# Altium footprint library Selex_PCBLib.PcbLib: 388 footprints (part 21 of 25)
Each footprint in its own frame and in the unit in brackets; x right, y up, seen from the top. Pads: shape width x height; smd on the part's side, far side on the other; paste and mask are expansions set on the pad; w line width, h text height; cw(c..) or ccw(c..) is an arc to the next point about the centre after c.
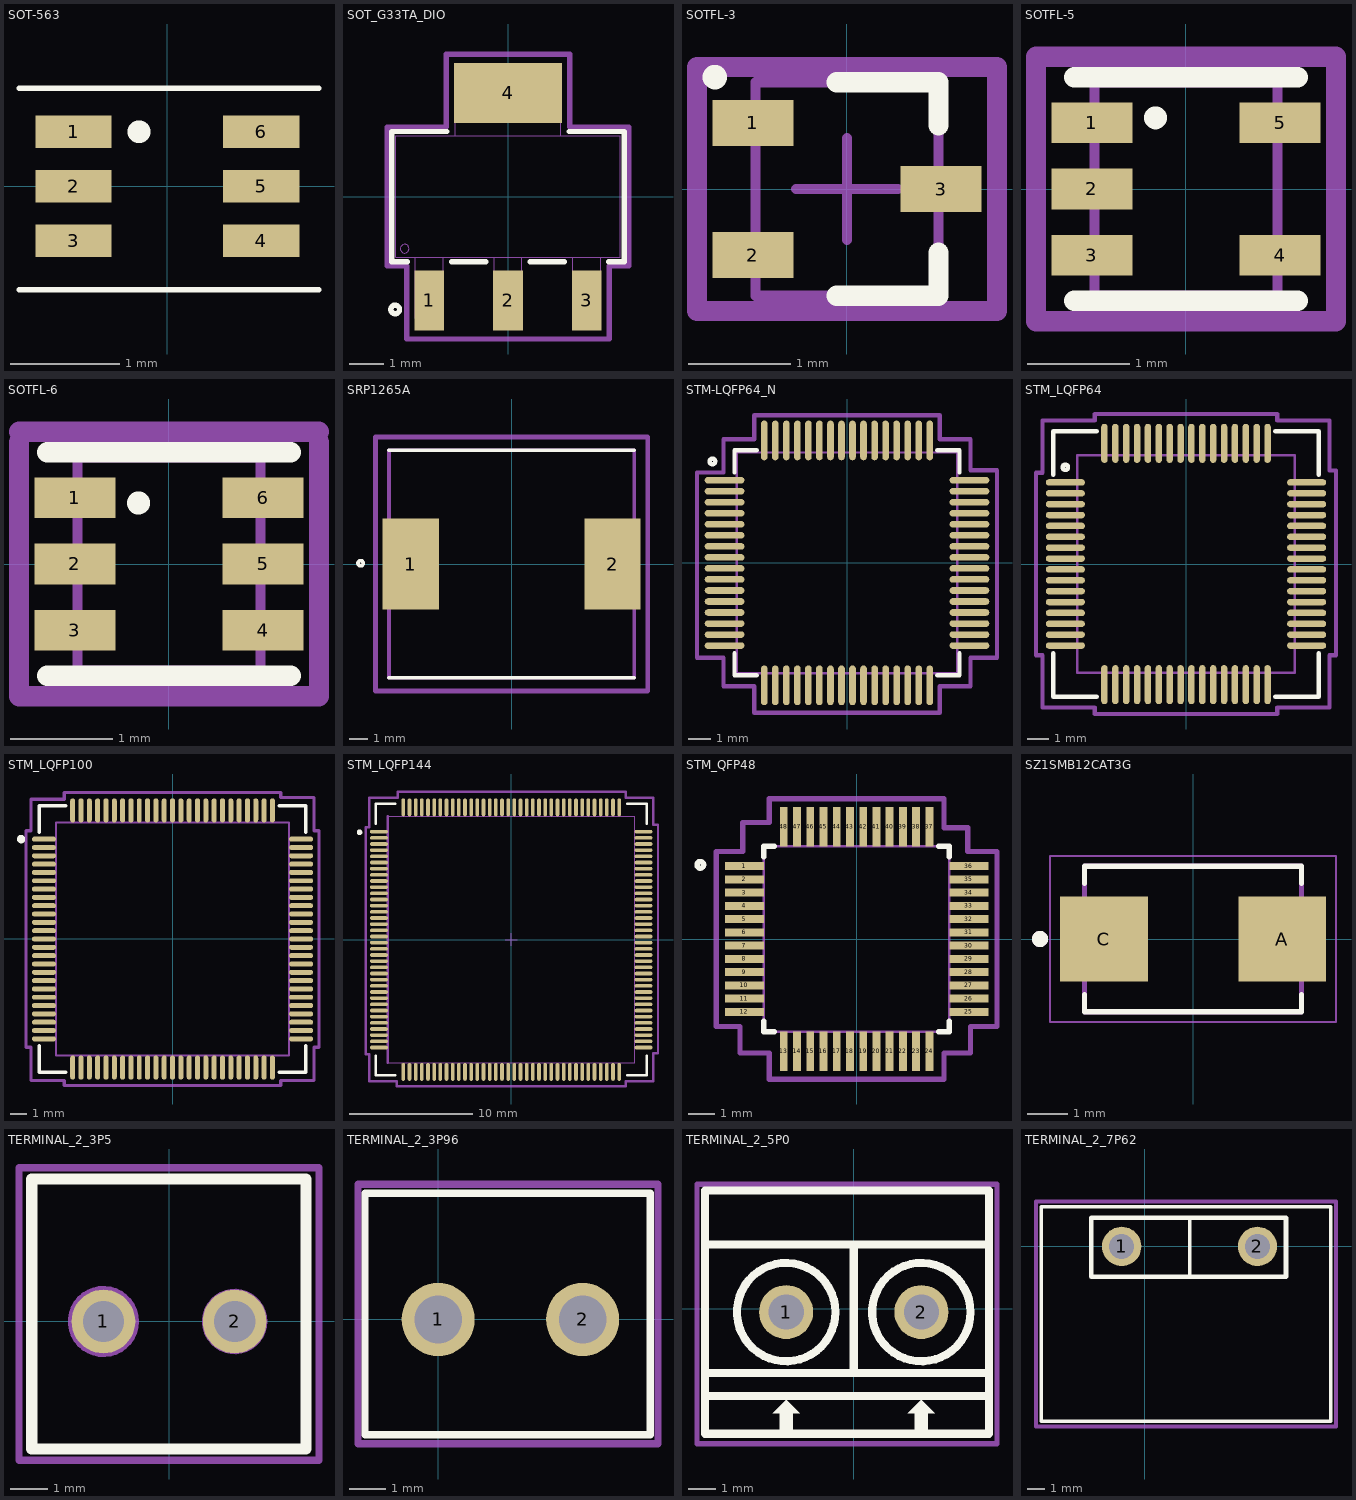
[diagram p20: the footprints below, top view; thin cyan lines are the x and y axes]

## SOT-563 [mm]
pads (6):
  rect 0.7x0.3 smd: 1(-0.86,0.5) 2(-0.86,0) 3(-0.86,-0.5) 4(0.86,-0.5) 5(0.86,0) 6(0.86,0.5)
Top Overlay:
  circle w0.2: c-0.26,0.5 r0.005
  lines w0.05: -1.36,-0.95 1.39,-0.95 ; -1.36,0.9 1.39,0.9
3D body "SOT563_AP61100QZ6-7_DIO.step": height 0.61, standoff 0, extent -0.91,-0.851 0.79,0.851

## SOT_G33TA_DIO [mil]
pads (4):
  rect 34x69 smd paste+0 mask+0: 1(-90.55,-119.5) 2(0,-119.5) 3(90.55,-119.5)
  rect 124x69 smd paste+0 mask+0: 4(0,119.5)
Top Overlay:
  circle w6: c-130,-130 r5
  lines w6: -116.01,-75 -134,-75 -134,75 -70.46,75 ; -65.09,-75 -25.46,-75 ; 25.46,-75 65.09,-75 ; 70.46,75 134,75 134,-75 116.01,-75
Mechanical 13:
  circle w0: c-119,-60 r5
  lines w1: -129,-70 -129,70 129,70 129,-70 -129,-70 ; -106.55,-140 -74.55,-140 -74.55,-70 -106.55,-70 -106.55,-140 ; -61,70 -61,140 61,140 61,70 -61,70 ; -16,-140 16,-140 16,-70 -16,-70 -16,-140 ; 74.55,-140 106.55,-140 106.55,-70 74.55,-70 74.55,-140
Mechanical 15:
  lines w6: -139,-80 -116.55,-80 -116.55,-164 116.55,-164 116.55,-80 139,-80 139,80 71,80 71,164 -71,164 -71,80 -139,80 -139,-80
3D body: height 10, standoff 0, extent 0,0 10,10

## SOTFL-3 [mm]
pads (3):
  rect 0.8x0.45 smd: 1(-0.925,0.65) 2(-0.925,-0.65) 3(0.925,0)
Top Overlay:
  circle w0.2: c-1.3,1.1 r0.02
  lines w0.2: -0.1,-1.05 0.9,-1.05 0.9,-0.625 ; -0.1,1.05 0.9,1.05 0.9,0.625
Mechanical 13:
  lines w0.1: -0.9,-1.05 -0.9,1.05 0.9,1.05 0.9,-1.05 -0.9,-1.05
Mechanical 15:
  lines w0.1: -0.5,0 0.5,0 ; 0,-0.5 0,0.5
  lines w0.2: -1.475,-1.2 -1.475,1.2 1.475,1.2 1.475,-1.2 -1.475,-1.2
3D body "User Library-sot-3p290x130ll237h100.STEP": height 1, standoff 0, extent -1.085,-1.45 1.285,1.45

## SOTFL-5 [mm]
pads (5):
  rect 0.8x0.4 smd: 1(-0.925,0.65) 2(-0.925,0) 3(-0.925,-0.65) 4(0.925,-0.65) 5(0.925,0.65)
Top Overlay:
  circle w0.2: c-0.3,0.7 r0.012
  lines w0.2: -1.1,-1.1 1.1,-1.1 ; -1.1,1.1 1.1,1.1
Mechanical 13:
  lines w0.1: -0.9,-1.05 0.9,-1.05 0.9,1.05 -0.9,1.05 -0.9,-1.05
Mechanical 15:
  lines w0.2: -1.475,-1.3 1.475,-1.3 1.475,1.3 -1.475,1.3 -1.475,-1.3
3D body: height 0.75, standoff 0, extent -0.9,-1.05 0.9,1.05

## SOTFL-6 [mm]
pads (6):
  rect 0.8x0.4 smd: 1(-0.925,0.65) 2(-0.925,0) 3(-0.925,-0.65) 4(0.925,-0.65) 5(0.925,0) 6(0.925,0.65)
Top Overlay:
  circle w0.2: c-0.3,0.6 r0.012
  lines w0.2: -1.2,-1.1 1.2,-1.1 ; -1.2,1.1 1.2,1.1
Mechanical 13:
  lines w0.1: -0.9,-1.05 -0.9,1.05 0.9,1.05 0.9,-1.05 -0.9,-1.05
Mechanical 15:
  lines w0.2: -1.475,1.2 -1.475,-1.3 1.475,-1.3 1.475,1.2 ; -1.475,1.3 -0.737,1.3 0.738,1.3 1.475,1.3
3D body: height 0.75, standoff 0, extent -0.9,-1.05 0.9,1.05

## SRP1265A [mm]
pads (2):
  rect 3.1x5 smd: 1(-5.55,0) 2(5.55,0)
Top Overlay:
  circle w0.2: c-8.311,0.042 r0.143
  lines w0.2: -6.75,-6.25 6.75,-6.25 ; -6.75,6.25 6.75,6.25
Mechanical 13:
  lines w0.2: -6.75,-6.25 -6.75,6.25 6.75,6.25 6.75,-6.25 -6.75,-6.25
Mechanical 15:
  lines w0.254: -7.493,-6.985 -7.493,6.985 7.493,6.985 7.493,-6.985 -7.493,-6.985
3D body "SRP1265A series.stp": height 6.31, standoff 0, extent -6.4,-6.2 6.5,6.3

## STM-LQFP64_N [mm] "Thin QFP, 64-Leads, Body 10x10mm, Pitch 0.5mm, IPC Medium Density"
height 1.6
pads (64):
  oval 1.8x0.3 smd: 1(-5.55,3.75) 2(-5.55,3.25) 3(-5.55,2.75) 4(-5.55,2.25) 5(-5.55,1.75) 6(-5.55,1.25) 7(-5.55,0.75) 8(-5.55,0.25) 9(-5.55,-0.25) 10(-5.55,-0.75) 11(-5.55,-1.25) 12(-5.55,-1.75) 13(-5.55,-2.25) 14(-5.55,-2.75) 15(-5.55,-3.25) 16(-5.55,-3.75) 33(5.55,-3.75) 34(5.55,-3.25) 35(5.55,-2.75) 36(5.55,-2.25) 37(5.55,-1.75) 38(5.55,-1.25) 39(5.55,-0.75) 40(5.55,-0.25) 41(5.55,0.25) 42(5.55,0.75) 43(5.55,1.25) 44(5.55,1.75) 45(5.55,2.25) 46(5.55,2.75) 47(5.55,3.25) 48(5.55,3.75)
  oval 0.3x1.8 smd: 17(-3.75,-5.55) 18(-3.25,-5.55) 19(-2.75,-5.55) 20(-2.25,-5.55) 21(-1.75,-5.55) 22(-1.25,-5.55) 23(-0.75,-5.55) 24(-0.25,-5.55) 25(0.25,-5.55) 26(0.75,-5.55) 27(1.25,-5.55) 28(1.75,-5.55) 29(2.25,-5.55) 30(2.75,-5.55) 31(3.25,-5.55) 32(3.75,-5.55) 49(3.75,5.55) 50(3.25,5.55) 51(2.75,5.55) 52(2.25,5.55) 53(1.75,5.55) 54(1.25,5.55) 55(0.75,5.55) 56(0.25,5.55) 57(-0.25,5.55) 58(-0.75,5.55) 59(-1.25,5.55) 60(-1.75,5.55) 61(-2.25,5.55) 62(-2.75,5.55) 63(-3.25,5.55) 64(-3.75,5.55)
Top Overlay:
  circle w0.2: c-6.1,4.6 r0.125
  lines w0.2: -5.1,-4.1 -5.1,-5.1 -4.1,-5.1 ; -5.1,4.1 -5.1,5.1 -4.1,5.1 ; 4.1,-5.1 5.1,-5.1 5.1,-4.1 ; 4.1,5.1 5.1,5.1 5.1,4.1
Mechanical 13:
  lines w0.1: -5,-5 -5,5 5,5 5,-5 -5,-5
Mechanical 15:
  lines w0.2: -6.8,-4.3 -6.8,4.1 -5.6,4.1 -5.6,5.6 -4.2,5.6 -4.2,6.7 4.2,6.7 4.2,5.6 5.6,5.6 5.6,4.2 6.8,4.2 6.8,-4.3 5.6,-4.3 5.6,-5.6 4.2,-5.6 4.2,-6.8 -4.2,-6.8 -4.2,-5.6 -5.6,-5.6 -5.6,-4.3 -6.8,-4.3
3D body: height 1.6, standoff 0.05, extent -5,-5 5,5

## STM_LQFP64 [mm]
pads (64):
  oval 1.8x0.3 smd: 1(-5.55,3.75) 2(-5.55,3.25) 3(-5.55,2.75) 4(-5.55,2.25) 5(-5.55,1.75) 6(-5.55,1.25) 7(-5.55,0.75) 8(-5.55,0.25) 9(-5.55,-0.25) 10(-5.55,-0.75) 11(-5.55,-1.25) 12(-5.55,-1.75) 13(-5.55,-2.25) 14(-5.55,-2.75) 15(-5.55,-3.25) 16(-5.55,-3.75) 33(5.55,-3.75) 34(5.55,-3.25) 35(5.55,-2.75) 36(5.55,-2.25) 37(5.55,-1.75) 38(5.55,-1.25) 39(5.55,-0.75) 40(5.55,-0.25) 41(5.55,0.25) 42(5.55,0.75) 43(5.55,1.25) 44(5.55,1.75) 45(5.55,2.25) 46(5.55,2.75) 47(5.55,3.25) 48(5.55,3.75)
  oval 0.3x1.8 smd: 17(-3.75,-5.55) 18(-3.25,-5.55) 19(-2.75,-5.55) 20(-2.25,-5.55) 21(-1.75,-5.55) 22(-1.25,-5.55) 23(-0.75,-5.55) 24(-0.25,-5.55) 25(0.25,-5.55) 26(0.75,-5.55) 27(1.25,-5.55) 28(1.75,-5.55) 29(2.25,-5.55) 30(2.75,-5.55) 31(3.25,-5.55) 32(3.75,-5.55) 49(3.75,5.55) 50(3.25,5.55) 51(2.75,5.55) 52(2.25,5.55) 53(1.75,5.55) 54(1.25,5.55) 55(0.75,5.55) 56(0.25,5.55) 57(-0.25,5.55) 58(-0.75,5.55) 59(-1.25,5.55) 60(-1.75,5.55) 61(-2.25,5.55) 62(-2.75,5.55) 63(-3.25,5.55) 64(-3.75,5.55)
Top Overlay:
  circle w0.2: c-5.55,4.45 r0.125
  lines w0.2: -6.1,-4.1 -6.1,-6.1 -4.1,-6.1 ; -6.1,4.1 -6.1,6.1 -4.1,6.1 ; 4.1,-6.1 6.1,-6.1 6.1,-4.1 ; 4.1,6.1 6.1,6.1 6.1,4.1
Mechanical 13:
  lines w0.1: -5,-5 5,-5 5,5 -5,5 -5,-5
Mechanical 15:
  lines w0.2: -6.9,-4.2 -6.6,-4.2 -6.6,-6.6 -4.2,-6.6 -4.2,-6.9 4.2,-6.9 4.2,-6.6 6.6,-6.6 6.6,-4.2 6.9,-4.2 6.9,4.3 6.6,4.3 6.6,6.6 4.2,6.6 4.2,6.9 -4.2,6.9 -4.2,6.6 -6.6,6.6 -6.6,4.2 -6.9,4.2 -6.9,-4.2
3D body "LQFP64 v1.step": height 1.6, standoff 0.02, extent -6.069,-6.069 6.069,6.069

## STM_LQFP100 [mm]
pads (100):
  oval 1.45x0.3 smd: 1(-7.725,6) 2(-7.725,5.5) 3(-7.725,5) 4(-7.725,4.5) 5(-7.725,4) 6(-7.725,3.5) 7(-7.725,3) 8(-7.725,2.5) 9(-7.725,2) 10(-7.725,1.5) 11(-7.725,1) 12(-7.725,0.5) 13(-7.725,0) 14(-7.725,-0.5) 15(-7.725,-1) 16(-7.725,-1.5) 17(-7.725,-2) 18(-7.725,-2.5) 19(-7.725,-3) 20(-7.725,-3.5) 21(-7.725,-4) 22(-7.725,-4.5) 23(-7.725,-5) 24(-7.725,-5.5) 25(-7.725,-6) 51(7.725,-6) 52(7.725,-5.5) 53(7.725,-5) 54(7.725,-4.5) 55(7.725,-4) 56(7.725,-3.5) 57(7.725,-3) 58(7.725,-2.5) 59(7.725,-2) 60(7.725,-1.5) 61(7.725,-1) 62(7.725,-0.5) 63(7.725,0) 64(7.725,0.5) 65(7.725,1) 66(7.725,1.5) 67(7.725,2) 68(7.725,2.5) 69(7.725,3) 70(7.725,3.5) 71(7.725,4) 72(7.725,4.5) 73(7.725,5) 74(7.725,5.5) 75(7.725,6)
  oval 0.3x1.45 smd: 26(-6,-7.725) 27(-5.5,-7.725) 28(-5,-7.725) 29(-4.5,-7.725) 30(-4,-7.725) 31(-3.5,-7.725) 32(-3,-7.725) 33(-2.5,-7.725) 34(-2,-7.725) 35(-1.5,-7.725) 36(-1,-7.725) 37(-0.5,-7.725) 38(0,-7.725) 39(0.5,-7.725) 40(1,-7.725) 41(1.5,-7.725) 42(2,-7.725) 43(2.5,-7.725) 44(3,-7.725) 45(3.5,-7.725) 46(4,-7.725) 47(4.5,-7.725) 48(5,-7.725) 49(5.5,-7.725) 50(6,-7.725) 76(6,7.725) 77(5.5,7.725) 78(5,7.725) 79(4.5,7.725) 80(4,7.725) 81(3.5,7.725) 82(3,7.725) 83(2.5,7.725) 84(2,7.725) 85(1.5,7.725) 86(1,7.725) 87(0.5,7.725) 88(0,7.725) 89(-0.5,7.725) 90(-1,7.725) 91(-1.5,7.725) 92(-2,7.725) 93(-2.5,7.725) 94(-3,7.725) 95(-3.5,7.725) 96(-4,7.725) 97(-4.5,7.725) 98(-5,7.725) 99(-5.5,7.725) 100(-6,7.725)
Top Overlay:
  circle w0.25: c-9.1,6 r0.125
  lines w0.2: -8,-6.4 -8,-8 -6.4,-8 ; -8,6.4 -8,8 -6.4,8 ; 6.4,-8 8,-8 8,-6.4 ; 6.4,8 8,8 8,6.4
Mechanical 13:
  lines w0.1: -7,-7 7,-7 7,7 -7,7 -7,-7
Mechanical 15:
  lines w0.2: -8.8,-6.5 -8.8,6.5 -8.5,6.5 -8.5,8.4 -6.5,8.4 -6.5,8.8 6.5,8.8 6.5,8.5 8.5,8.5 8.5,6.5 8.8,6.5 8.8,-6.5 8.5,-6.5 8.5,-8.5 6.5,-8.5 6.5,-8.8 -6.5,-8.8 -6.5,-8.5 -8.5,-8.5 -8.5,-6.5 -8.8,-6.5
3D body "LQFP100.step": height 1.6, standoff 0, extent -8,-8 8,8

## STM_LQFP144 [mm]
pads (144):
  oval 1.45x0.3 smd: 1(-10.725,8.75) 2(-10.725,8.25) 3(-10.725,7.75) 4(-10.725,7.25) 5(-10.725,6.75) 6(-10.725,6.25) 7(-10.725,5.75) 8(-10.725,5.25) 9(-10.725,4.75) 10(-10.725,4.25) 11(-10.725,3.75) 12(-10.725,3.25) 13(-10.725,2.75) 14(-10.725,2.25) 15(-10.725,1.75) 16(-10.725,1.25) 17(-10.725,0.75) 18(-10.725,0.25) 19(-10.725,-0.25) 20(-10.725,-0.75) 21(-10.725,-1.25) 22(-10.725,-1.75) 23(-10.725,-2.25) 24(-10.725,-2.75) 25(-10.725,-3.25) 26(-10.725,-3.75) 27(-10.725,-4.25) 28(-10.725,-4.75) 29(-10.725,-5.25) 30(-10.725,-5.75) 31(-10.725,-6.25) 32(-10.725,-6.75) 33(-10.725,-7.25) 34(-10.725,-7.75) 35(-10.725,-8.25) 36(-10.725,-8.75) 73(10.725,-8.75) 74(10.725,-8.25) 75(10.725,-7.75) 76(10.725,-7.25) 77(10.725,-6.75) 78(10.725,-6.25) 79(10.725,-5.75) 80(10.725,-5.25) 81(10.725,-4.75) 82(10.725,-4.25) 83(10.725,-3.75) 84(10.725,-3.25) 85(10.725,-2.75) 86(10.725,-2.25) 87(10.725,-1.75) 88(10.725,-1.25) 89(10.725,-0.75) 90(10.725,-0.25) 91(10.725,0.25) 92(10.725,0.75) 93(10.725,1.25) 94(10.725,1.75) 95(10.725,2.25) 96(10.725,2.75) 97(10.725,3.25) 98(10.725,3.75) 99(10.725,4.25) 100(10.725,4.75) 101(10.725,5.25) 102(10.725,5.75) 103(10.725,6.25) 104(10.725,6.75) 105(10.725,7.25) 106(10.725,7.75) 107(10.725,8.25) 108(10.725,8.75)
  oval 0.3x1.45 smd: 37(-8.75,-10.725) 38(-8.25,-10.725) 39(-7.75,-10.725) 40(-7.25,-10.725) 41(-6.75,-10.725) 42(-6.25,-10.725) 43(-5.75,-10.725) 44(-5.25,-10.725) 45(-4.75,-10.725) 46(-4.25,-10.725) 47(-3.75,-10.725) 48(-3.25,-10.725) 49(-2.75,-10.725) 50(-2.25,-10.725) 51(-1.75,-10.725) 52(-1.25,-10.725) 53(-0.75,-10.725) 54(-0.25,-10.725) 55(0.25,-10.725) 56(0.75,-10.725) 57(1.25,-10.725) 58(1.75,-10.725) 59(2.25,-10.725) 60(2.75,-10.725) 61(3.25,-10.725) 62(3.75,-10.725) 63(4.25,-10.725) 64(4.75,-10.725) 65(5.25,-10.725) 66(5.75,-10.725) 67(6.25,-10.725) 68(6.75,-10.725) 69(7.25,-10.725) 70(7.75,-10.725) 71(8.25,-10.725) 72(8.75,-10.725) 109(8.75,10.725) 110(8.25,10.725) 111(7.75,10.725) 112(7.25,10.725) 113(6.75,10.725) 114(6.25,10.725) 115(5.75,10.725) 116(5.25,10.725) 117(4.75,10.725) 118(4.25,10.725) 119(3.75,10.725) 120(3.25,10.725) 121(2.75,10.725) 122(2.25,10.725) 123(1.75,10.725) 124(1.25,10.725) 125(0.75,10.725) 126(0.25,10.725) 127(-0.25,10.725) 128(-0.75,10.725) 129(-1.25,10.725) 130(-1.75,10.725) 131(-2.25,10.725) 132(-2.75,10.725) 133(-3.25,10.725) 134(-3.75,10.725) 135(-4.25,10.725) 136(-4.75,10.725) 137(-5.25,10.725) 138(-5.75,10.725) 139(-6.25,10.725) 140(-6.75,10.725) 141(-7.25,10.725) 142(-7.75,10.725) 143(-8.25,10.725) 144(-8.75,10.725)
Top Overlay:
  circle w0.2: c-12.3,8.7 r0.125
  lines w0.2: -11,-9.4 -11,-11 -9.4,-11 ; -11,9.4 -11,11 -9.4,11 ; 9.4,-11 11,-11 11,-9.4 ; 9.4,11 11,11 11,9.4
Mechanical 13:
  lines w0.1: -10,-10 10,-10 10,10 -10,10
  lines w0.2: -10,-10 -10,10
Mechanical 15:
  lines w0.1: -0.5,0 0.5,0 ; 0,-0.5 0,0.5
  lines w0.2: -11.8,-9.3 -11.5,-9.3 -11.5,-11.5 -9.3,-11.5 -9.3,-11.9 9.3,-11.9 9.3,-11.5 11.5,-11.5 11.5,-9.2 11.9,-9.2 11.9,9.3 11.5,9.3 11.5,11.5 9.3,11.5 9.3,12 -9.2,12 -9.2,11.5 -11.5,11.5 -11.5,9.1 -11.8,9.1 -11.8,-9.3
3D body "LQFP144.step": height 1.6, standoff 0, extent -11,-11 11,11

## STM_QFP48 [mm]
pads (48):
  rect 1.475x0.3 smd: 1(-4.238,2.75) 2(-4.238,2.25) 3(-4.238,1.75) 4(-4.238,1.25) 5(-4.238,0.75) 6(-4.238,0.25) 7(-4.238,-0.25) 8(-4.238,-0.75) 9(-4.238,-1.25) 10(-4.238,-1.75) 11(-4.238,-2.25) 12(-4.238,-2.75) 25(4.238,-2.75) 26(4.238,-2.25) 27(4.238,-1.75) 28(4.238,-1.25) 29(4.238,-0.75) 30(4.238,-0.25) 31(4.238,0.25) 32(4.238,0.75) 33(4.238,1.25) 34(4.238,1.75) 35(4.238,2.25) 36(4.238,2.75)
  rect 0.3x1.475 smd: 13(-2.75,-4.238) 14(-2.25,-4.238) 15(-1.75,-4.238) 16(-1.25,-4.238) 17(-0.75,-4.238) 18(-0.25,-4.238) 19(0.25,-4.238) 20(0.75,-4.238) 21(1.25,-4.238) 22(1.75,-4.238) 23(2.25,-4.238) 24(2.75,-4.238) 37(2.75,4.238) 38(2.25,4.238) 39(1.75,4.238) 40(1.25,4.238) 41(0.75,4.238) 42(0.25,4.238) 43(-0.25,4.238) 44(-0.75,4.238) 45(-1.25,4.238) 46(-1.75,4.238) 47(-2.25,4.238) 48(-2.75,4.238)
Top Overlay:
  circle w0.2: c-5.9,2.8 r0.125
  lines w0.2: -3.5,-3.1 -3.5,-3.5 -3.1,-3.5 ; -3.5,3.1 -3.5,3.5 -3.1,3.5 ; 3.1,-3.5 3.5,-3.5 3.5,-3.1 ; 3.1,3.5 3.5,3.5 3.5,3.1
Mechanical 13:
  lines w0.1: -3.5,-3.5 -3.5,3.5 3.5,3.5 3.5,-3.5 -3.5,-3.5
Mechanical 15:
  lines w0.2: -5.3,-3.3 -5.3,3.3 -4.3,3.3 -4.3,4.4 -3.3,4.4 -3.3,5.3 3.3,5.3 3.3,4.2 4.2,4.2 4.2,3.3 5.3,3.3 5.3,-3.3 4.3,-3.3 4.3,-4.3 3.3,-4.3 3.3,-5.3 -3.3,-5.3 -3.3,-4.3 -4.4,-4.3 -4.4,-3.3 -5.3,-3.3
3D body "STM32G431C6T6.stp": height 0, standoff 0, extent 0,0 0,0

## SZ1SMB12CAT3G [mm]
pads (2):
  rect 2.18x2.12 smd: A(2.215,0) C(-2.215,0)
Top Overlay:
  circle w0.2: c-3.805,0 r0.1
  lines w0.127: -2.7,-1.38 -2.7,-1.81 2.7,-1.81 2.7,-1.38 ; -2.7,1.38 -2.7,1.81 2.7,1.81 2.7,1.38
Mechanical 13:
  circle w0.2: c-3.805,0 r0.1
  lines w0.127: -2.7,-1.81 2.7,-1.81 2.7,1.81 -2.7,1.81 -2.7,-1.81
Mechanical 15:
  lines w0.05: -3.555,-2.06 3.555,-2.06 3.555,2.06 -3.555,2.06 -3.555,-2.06

## TERMINAL_2_3P5 [mm]
pads (2):
  round 1.7 hole 1.1 mask+0.1: 1(-1.75,0) 2(1.75,0)
Top Overlay:
  lines w0.3: -3.66,-3.4 3.65,-3.4 3.65,3.8 -3.66,3.8 -3.66,-3.4
Mechanical 1:
  circle w0.05: c1.75,0 r0.85
  circle w0.2: c-1.75,0 r0.85
  lines w0.05: -3.69,-3.4 -3.69,3.77 3.68,3.77 3.68,-3.4 -3.69,-3.4
  text "2" at 1.4,-0.6 h1.2
  text "1" at -1.89,-0.572 h1.2
Mechanical 15:
  lines w0.2: -4,-3.7 4,-3.7 4,4.1 -4,4.1 -4,-3.7
3D body "terminal 3.5x2.step": height 8.51, standoff -3.5, extent -3.556,-3.5 3.556,3.79

## TERMINAL_2_3P96 [mm]
pads (2):
  round 2 hole 1.3: 1(-0.01,0) 2(3.94,0)
Top Overlay:
  lines w0.2: -2.01,-3.15 -2.01,3.45 5.79,3.45 5.79,-3.15 -2.01,-3.15
Mechanical 15:
  lines w0.2: -2.2,-3.4 -2.2,3.7 6,3.7 6,-3.4 -2.2,-3.4
3D body "DG350-3.96-02P-12-00AH.STEP": height 8.4, standoff -3.5, extent -2.11,-3.25 5.89,3.55

## TERMINAL_2_5P0 [mm]
pads (2):
  round 2 hole 1.3 mask+0.1: 1(-2.5,-0.13) 2(2.5,-0.13)
Top Overlay:
  circle w0.3: c-2.5,-0.13 r1.82
  circle w0.3: c2.5,-0.13 r1.82
  rectangle: 2.25,-4.63 2.75,-3.88
  rectangle: -2.75,-4.63 -2.25,-3.88
  region: 2,-3.88 2.5,-3.38 3,-3.88
  region: -3,-3.88 -2.5,-3.38 -2,-3.88
  lines w0.3: -5.5,-2.38 5,-2.38 ; -5.5,2.37 5,2.37 ; 0,-2.38 0,2.37 ; -5.5,-3.23 5,-3.23 ; -5.5,-3.23 -5.5,4.37 5,4.37 5,-3.23 ; -5.5,-3.23 -5.5,-4.63 5,-4.63 5,-3.23
Mechanical 1:
  circle w0.05: c-2.5,-0.13 r1.82
  circle w0.05: c2.5,-0.13 r1.82
  lines w0.05: -5.5,-2.38 5,-2.38 ; -5.5,2.37 5,2.37 ; 0,-2.38 0,2.37 ; -5.5,-3.23 -5.5,4.37 5,4.37 5,-3.23 -5.5,-3.23
  text "1" at -2.691,-0.701 h1.2
  text "2" at 2.199,-0.701 h1.2
Mechanical 15:
  lines w0.2: -5.8,-5 5.3,-5 5.3,4.6 -5.8,4.6 -5.8,-5
3D body "User Library-Terminal-Screw-3A-2way.STEP": height 10, standoff -3, extent -5.6,-3.168 5,4.432

## TERMINAL_2_7P62 [mm] "7.62mm pad distance"
pads (2):
  round 2.2 hole 1.4: 1(-1.3,-0.01) 2(6.3,-0.01)
Top Overlay:
  lines w0.2: 2.5,-1.71 2.5,1.59 ; -5.8,-9.8 10.4,-9.8 10.4,-1.9 10.4,2.2 -5.8,2.2 -5.8,-9.8
  lines w0.254: -3,-1.71 -3,1.59 7.9,1.59 7.9,-1.71 -3,-1.71
Mechanical 15:
  lines w0.2: -6.1,-10.1 10.7,-10.1 10.7,2.5 -6.1,2.5 -6.1,-10.1
3D body "Bornera_7_62mm_2P.STEP": height 15.61, standoff -1.34, extent -5.77,-9.91 10.37,2.19